# Altium footprint library smd-ipc.PCBLIB: 363 footprints (part 5 of 27)
Each footprint in its own frame and in the unit in brackets; x right, y up, seen from the top. Pads: shape width x height; smd on the part's side, far side on the other; paste and mask are expansions set on the pad; w line width, h text height; cw(c..) or ccw(c..) is an arc to the next point about the centre after c.
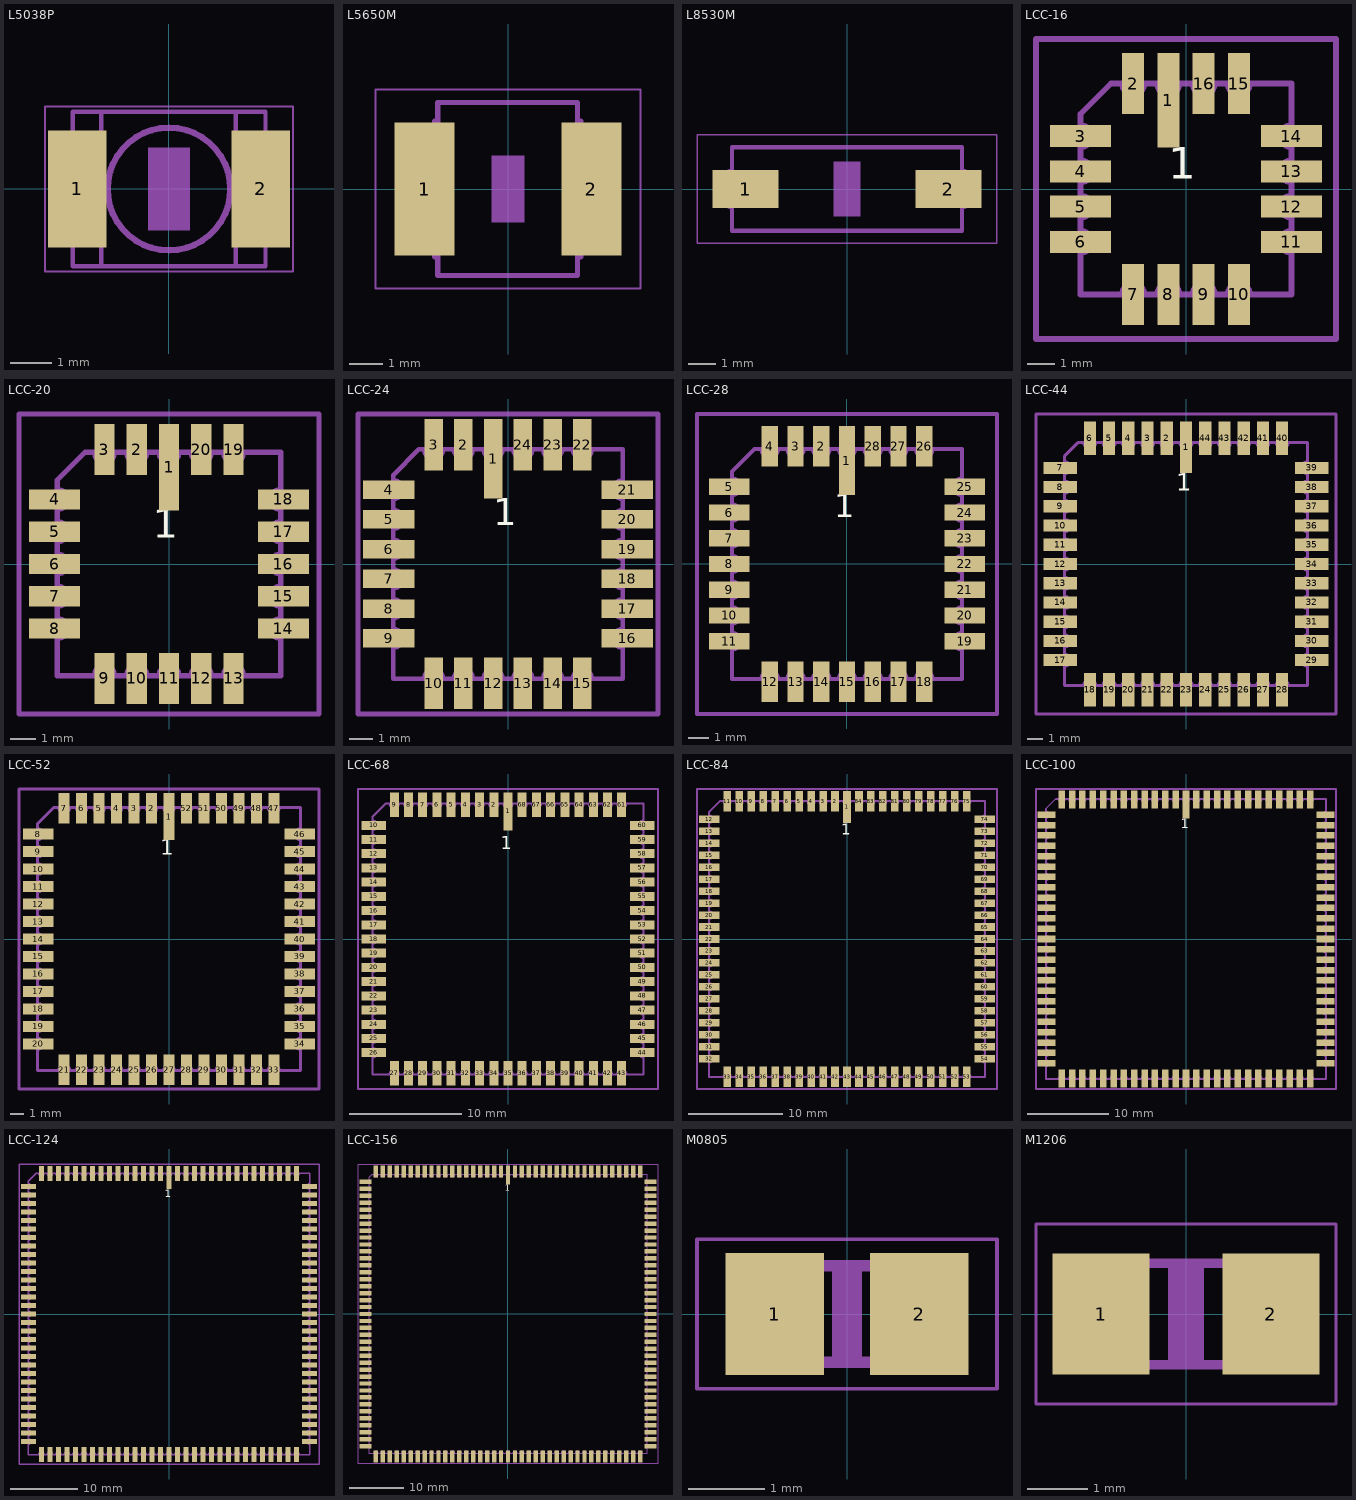
[diagram p4: the footprints below, top view; thin cyan lines are the x and y axes]

## L5038P [mm]
pads (2):
  rect 1.4x2.8 smd: 1(-2.2,0) 2(2.2,0)
Mechanical 6:
  rectangle: -0.5,-1 0.5,1
Mechanical 16:
  circle w0.152: c0,0 r1.473
  lines w0.102: -2.386,-1.27 -2.386,1.27 ; -2.31,-1.854 -2.31,1.854 ; -2.286,-1.856 2.311,-1.856 ; -2.286,1.853 2.311,1.853 ; -1.624,-1.854 -1.624,1.854 ; 1.602,-1.854 1.602,1.854 ; 2.313,-1.854 2.313,1.854 ; 2.389,-1.27 2.389,1.27
Mechanical 27:
  lines w0.051: -2.973,-1.983 2.973,-1.983 2.973,1.983 -2.973,1.983 -2.973,-1.983

## L5650M [mm]
pads (2):
  rect 1.8x4 smd: 1(-2.5,0) 2(2.5,0)
Mechanical 6:
  rectangle: -0.5,-1 0.5,1
Mechanical 16:
  lines w0.152: -2.21,-2.032 -2.21,2.032 ; 2.184,-2.032 2.184,2.032 ; -2.108,-2.591 2.083,-2.591 2.083,2.591 -2.108,2.591 -2.108,-2.591
Mechanical 27:
  lines w0.051: -3.973,-2.983 3.973,-2.983 3.973,2.983 -3.973,2.983 -3.973,-2.983

## L8530M [mm]
pads (2):
  rect 2.4x1.4 smd: 1(-3.7,0) 2(3.7,0)
Mechanical 6:
  rectangle: -0.5,-1 0.5,1
Mechanical 16:
  lines w0.152: -4.293,-0.66 -4.293,0.66 ; 4.293,-0.66 4.293,0.66 ; -4.191,-1.524 -4.191,1.524 4.191,1.524 4.191,-1.524 -4.191,-1.524
Mechanical 27:
  lines w0.051: -5.473,-1.983 5.473,-1.983 5.473,1.983 -5.473,1.983 -5.473,-1.983

## LCC-16 [mil]
pads (16):
  rect 31.5x133.86 smd: 1(-25,125.98)
  rect 31.5x86.61 smd: 2(-75,149.61) 7(-75,-149.61) 8(-25,-149.61) 9(25,-149.61) 10(75,-149.61) 15(75,149.61) 16(25,149.61)
  rect 86.61x31.5 smd: 3(-149.61,75) 4(-149.61,25) 5(-149.61,-25) 6(-149.61,-75) 11(149.61,-75) 12(149.61,-25) 13(149.61,25) 14(149.61,75)
Top Overlay:
  text "1" at -25,0 h77.5
Mechanical 16:
  lines w8: -149.61,-150 -149.61,-149.61 ; -149.61,-90.75 -149.61,-149.61 ; -149.61,-59.25 -149.61,-40.75 ; -149.61,-9.25 -149.61,9.25 ; -149.61,40.75 -149.61,59.25 ; -149.61,90.75 -149.61,106.3 -106.3,149.61 -90.75,149.61 ; -149.54,-90.75 ccw(c-149.54,-75) -149.54,-59.25 ; -149.54,-40.75 ccw(c-149.54,-25) -149.54,-9.25 ; -149.54,9.25 ccw(c-149.54,25) -149.54,40.75 ; -149.54,59.25 ccw(c-149.54,75) -149.54,90.75 ; -90.75,-149.61 -149.61,-149.61 ; -90.75,-149.54 cw(c-75,-149.54) -59.25,-149.54 ; -90.75,149.54 ccw(c-75,149.54) -59.25,149.54 ; -59.25,-149.61 -40.75,-149.61 ; -59.25,149.61 -40.75,149.61 ; -40.75,-149.54 cw(c-25,-149.54) -9.25,-149.54 ; -40.75,149.54 ccw(c-25,149.54) -9.25,149.54 ; -9.25,-149.61 9.25,-149.61 ; -9.25,149.61 9.25,149.61 ; 9.25,-149.54 cw(c25,-149.54) 40.75,-149.54 ; 9.25,149.54 ccw(c25,149.54) 40.75,149.54 ; 40.75,-149.61 59.25,-149.61 ; 40.75,149.61 59.25,149.61 ; 59.25,-149.54 cw(c75,-149.54) 90.75,-149.54 ; 59.25,149.54 ccw(c75,149.54) 90.75,149.54 ; 90.75,-149.61 149.61,-149.61 149.61,-90.75 ; 90.75,149.61 149.61,149.61 149.61,90.75 ; 149.54,-90.75 cw(c149.54,-75) 149.54,-59.25 ; 149.54,-40.75 cw(c149.54,-25) 149.54,-9.25 ; 149.54,9.25 cw(c149.54,25) 149.54,40.75 ; 149.54,59.25 cw(c149.54,75) 149.54,90.75 ; 149.61,-59.25 149.61,-40.75 ; 149.61,-9.25 149.61,9.25 ; 149.61,40.75 149.61,59.25
Mechanical 27:
  lines w7.87: -212.72,-212.72 212.72,-212.72 212.72,212.72 -212.72,212.72 -212.72,-212.72

## LCC-20 [mil]
pads (20):
  rect 31.5x133.86 smd: 1(0,149.61)
  rect 31.5x78.74 smd: 2(-50,177.17) 3(-100,177.17) 9(-100,-177.17) 10(-50,-177.17) 11(0,-177.17) 12(50,-177.17) 13(100,-177.17) 19(100,177.17) 20(50,177.17)
  rect 78.74x31.5 smd: 4(-177.17,100) 5(-177.17,50) 6(-177.17,0) 7(-177.17,-50) 8(-177.17,-100) 14(177.17,-100) 15(177.17,-50) 16(177.17,0) 17(177.17,50) 18(177.17,100)
Top Overlay:
  text "1" at -25,25 h77.5
Mechanical 16:
  lines w8: -173.23,-173.62 -173.23,-173.23 ; -173.23,-115.75 -173.23,-173.23 ; -173.23,-84.25 -173.23,-65.75 ; -173.23,-34.25 -173.23,-15.75 ; -173.23,15.75 -173.23,34.25 ; -173.23,65.75 -173.23,84.25 ; -173.23,115.75 -173.23,129.92 -129.92,173.23 -115.75,173.23 ; -173.17,-115.75 ccw(c-173.17,-100) -173.17,-84.25 ; -173.17,-65.75 ccw(c-173.17,-50) -173.17,-34.25 ; -173.17,-15.75 ccw(c-173.17,0) -173.17,15.75 ; -173.17,34.25 ccw(c-173.17,50) -173.17,65.75 ; -173.17,84.25 ccw(c-173.17,100) -173.17,115.75 ; -115.75,-173.23 -173.23,-173.23 ; -115.75,-173.17 cw(c-100,-173.17) -84.25,-173.17 ; -115.75,173.17 ccw(c-100,173.17) -84.25,173.17 ; -84.25,-173.23 -65.75,-173.23 ; -84.25,173.23 -65.75,173.23 ; -65.75,-173.17 cw(c-50,-173.17) -34.25,-173.17 ; -65.75,173.17 ccw(c-50,173.17) -34.25,173.17 ; -34.25,-173.23 -15.75,-173.23 ; -34.25,173.23 -15.75,173.23 ; -15.75,-173.17 cw(c0,-173.17) 15.75,-173.17 ; -15.75,173.17 ccw(c0,173.17) 15.75,173.17 ; 15.75,-173.23 34.25,-173.23 ; 15.75,173.23 34.25,173.23 ; 34.25,-173.17 cw(c50,-173.17) 65.75,-173.17 ; 34.25,173.17 ccw(c50,173.17) 65.75,173.17 ; 65.75,-173.23 84.25,-173.23 ; 65.75,173.23 84.25,173.23 ; 84.25,-173.17 cw(c100,-173.17) 115.75,-173.17 ; 84.25,173.17 ccw(c100,173.17) 115.75,173.17 ; 115.75,-173.23 173.23,-173.23 173.23,-115.75 ; 115.75,173.23 173.23,173.23 173.23,115.75 ; 173.17,-115.75 cw(c173.17,-100) 173.17,-84.25 ; 173.17,-65.75 cw(c173.17,-50) 173.17,-34.25 ; 173.17,-15.75 cw(c173.17,0) 173.17,15.75 ; 173.17,34.25 cw(c173.17,50) 173.17,65.75 ; 173.17,84.25 cw(c173.17,100) 173.17,115.75 ; 173.23,-84.25 173.23,-65.75 ; 173.23,-34.25 173.23,-15.75 ; 173.23,15.75 173.23,34.25 ; 173.23,65.75 173.23,84.25
Mechanical 27:
  lines w7.87: -232.4,-232.4 232.4,-232.4 232.4,232.4 -232.4,232.4 -232.4,-232.4

## LCC-24 [mil]
pads (24):
  rect 31.5x133.86 smd: 1(-25,177.17)
  rect 31.5x86.61 smd: 2(-75,200.79) 3(-125,200.79) 10(-125,-200.79) 11(-75,-200.79) 12(-25,-200.79) 13(25,-200.79) 14(75,-200.79) 15(125,-200.79) 22(125,200.79) 23(75,200.79) 24(25,200.79)
  rect 86.61x31.5 smd: 4(-200.79,125) 5(-200.79,75) 6(-200.79,25) 7(-200.79,-25) 8(-200.79,-75) 9(-200.79,-125) 16(200.79,-125) 17(200.79,-75) 18(200.79,-25) 19(200.79,25) 20(200.79,75) 21(200.79,125)
Top Overlay:
  text "1" at -25,50 h77.5
Mechanical 16:
  lines w8: -192.91,-140.75 -192.91,-192.91 -140.75,-192.91 ; -192.91,-109.25 -192.91,-90.75 ; -192.91,-59.25 -192.91,-40.75 ; -192.91,-9.25 -192.91,9.25 ; -192.91,40.75 -192.91,59.25 ; -192.91,90.75 -192.91,109.25 ; -192.91,140.75 -192.91,149.41 -149.61,192.72 -140.75,192.72 ; -192.85,-140.75 ccw(c-192.85,-125) -192.85,-109.25 ; -192.85,-90.75 ccw(c-192.85,-75) -192.85,-59.25 ; -192.85,-40.75 ccw(c-192.85,-25) -192.85,-9.25 ; -192.85,9.25 ccw(c-192.85,25) -192.85,40.75 ; -192.85,59.25 ccw(c-192.85,75) -192.85,90.75 ; -192.85,109.25 ccw(c-192.85,125) -192.85,140.75 ; -140.75,-192.85 cw(c-125,-192.85) -109.25,-192.85 ; -140.75,192.65 ccw(c-125,192.65) -109.25,192.65 ; -109.25,-192.91 -90.75,-192.91 ; -109.25,192.72 -90.75,192.72 ; -90.75,-192.85 cw(c-75,-192.85) -59.25,-192.85 ; -90.75,192.65 ccw(c-75,192.65) -59.25,192.65 ; -59.25,-192.91 -40.75,-192.91 ; -59.25,192.72 -40.75,192.72 ; -40.75,-192.85 cw(c-25,-192.85) -9.25,-192.85 ; -40.75,192.65 ccw(c-25,192.65) -9.25,192.65 ; -9.25,-192.91 9.25,-192.91 ; -9.25,192.72 9.25,192.72 ; 9.25,-192.85 cw(c25,-192.85) 40.75,-192.85 ; 9.25,192.65 ccw(c25,192.65) 40.75,192.65 ; 40.75,-192.91 59.25,-192.91 ; 40.75,192.72 59.25,192.72 ; 59.25,-192.85 cw(c75,-192.85) 90.75,-192.85 ; 59.25,192.65 ccw(c75,192.65) 90.75,192.65 ; 90.75,-192.91 109.25,-192.91 ; 90.75,192.72 109.25,192.72 ; 109.25,-192.85 cw(c125,-192.85) 140.75,-192.85 ; 109.25,192.65 ccw(c125,192.65) 140.75,192.65 ; 140.75,-192.91 192.91,-192.91 192.91,-140.75 ; 140.75,192.72 192.91,192.72 192.91,140.75 ; 192.85,-140.75 cw(c192.85,-125) 192.85,-109.25 ; 192.85,-90.75 cw(c192.85,-75) 192.85,-59.25 ; 192.85,-40.75 cw(c192.85,-25) 192.85,-9.25 ; 192.85,9.25 cw(c192.85,25) 192.85,40.75 ; 192.85,59.25 cw(c192.85,75) 192.85,90.75 ; 192.85,109.25 cw(c192.85,125) 192.85,140.75 ; 192.91,-109.25 192.91,-90.75 ; 192.91,-59.25 192.91,-40.75 ; 192.91,-9.25 192.91,9.25 ; 192.91,40.75 192.91,59.25 ; 192.91,90.75 192.91,109.25
Mechanical 27:
  lines w7.87: -252.09,-252.09 252.09,-252.09 252.09,252.09 -252.09,252.09 -252.09,-252.09

## LCC-28 [mil]
pads (28):
  rect 31.5x133.86 smd: 1(0,200.79)
  rect 31.5x78.74 smd: 2(-50,228.35) 3(-100,228.35) 4(-150,228.35) 12(-150,-228.35) 13(-100,-228.35) 14(-50,-228.35) 15(0,-228.35) 16(50,-228.35) 17(100,-228.35) 18(150,-228.35) 26(150,228.35) 27(100,228.35) 28(50,228.35)
  rect 78.74x31.5 smd: 5(-228.35,150) 6(-228.35,100) 7(-228.35,50) 8(-228.35,0) 9(-228.35,-50) 10(-228.35,-100) 11(-228.35,-150) 19(228.35,-150) 20(228.35,-100) 21(228.35,-50) 22(228.35,0) 23(228.35,50) 24(228.35,100) 25(228.35,150)
Top Overlay:
  text "1" at -25,75 h77.5
Mechanical 16:
  lines w8: -223.23,-165.75 -223.23,-223.23 ; -223.23,-134.25 -223.23,-115.75 ; -223.23,-84.25 -223.23,-65.75 ; -223.23,-34.25 -223.23,-15.75 ; -223.23,15.75 -223.23,34.25 ; -223.23,65.75 -223.23,84.25 ; -223.23,115.75 -223.23,134.25 ; -223.23,165.75 -223.23,179.92 -179.92,223.23 -165.75,223.23 ; -223.17,-165.75 ccw(c-223.17,-150) -223.17,-134.25 ; -223.17,-115.75 ccw(c-223.17,-100) -223.17,-84.25 ; -223.17,-65.75 ccw(c-223.17,-50) -223.17,-34.25 ; -223.17,-15.75 ccw(c-223.17,0) -223.17,15.75 ; -223.17,34.25 ccw(c-223.17,50) -223.17,65.75 ; -223.17,84.25 ccw(c-223.17,100) -223.17,115.75 ; -223.17,134.25 ccw(c-223.17,150) -223.17,165.75 ; -165.75,-223.23 -223.23,-223.23 ; -165.75,-223.17 cw(c-150,-223.17) -134.25,-223.17 ; -165.75,223.17 ccw(c-150,223.17) -134.25,223.17 ; -134.25,-223.23 -115.75,-223.23 ; -134.25,223.23 -115.75,223.23 ; -123.23,-223.62 -223.23,-223.23 ; -115.75,-223.17 cw(c-100,-223.17) -84.25,-223.17 ; -115.75,223.17 ccw(c-100,223.17) -84.25,223.17 ; -84.25,-223.23 -65.75,-223.23 ; -84.25,223.23 -65.75,223.23 ; -65.75,-223.17 cw(c-50,-223.17) -34.25,-223.17 ; -65.75,223.17 ccw(c-50,223.17) -34.25,223.17 ; -34.25,-223.23 -15.75,-223.23 ; -34.25,223.23 -15.75,223.23 ; -15.75,-223.17 cw(c0,-223.17) 15.75,-223.17 ; -15.75,223.17 ccw(c0,223.17) 15.75,223.17 ; 15.75,-223.23 34.25,-223.23 ; 15.75,223.23 34.25,223.23 ; 34.25,-223.17 cw(c50,-223.17) 65.75,-223.17 ; 34.25,223.17 ccw(c50,223.17) 65.75,223.17 ; 65.75,-223.23 84.25,-223.23 ; 65.75,223.23 84.25,223.23 ; 84.25,-223.17 cw(c100,-223.17) 115.75,-223.17 ; 84.25,223.17 ccw(c100,223.17) 115.75,223.17 ; 115.75,-223.23 134.25,-223.23 ; 115.75,223.23 134.25,223.23 ; 134.25,-223.17 cw(c150,-223.17) 165.75,-223.17 ; 134.25,223.17 ccw(c150,223.17) 165.75,223.17 ; 165.75,-223.23 223.23,-223.23 223.23,-165.75 ; 165.75,223.23 223.23,223.23 223.23,165.75 ; 223.17,-165.75 cw(c223.17,-150) 223.17,-134.25 ; 223.17,-115.75 cw(c223.17,-100) 223.17,-84.25 ; 223.17,-65.75 cw(c223.17,-50) 223.17,-34.25 ; 223.17,-15.75 cw(c223.17,0) 223.17,15.75 ; 223.17,34.25 cw(c223.17,50) 223.17,65.75 ; 223.17,84.25 cw(c223.17,100) 223.17,115.75 ; 223.17,134.25 cw(c223.17,150) 223.17,165.75 ; 223.23,-134.25 223.23,-115.75 ; 223.23,-84.25 223.23,-65.75 ; 223.23,-34.25 223.23,-15.75 ; 223.23,15.75 223.23,34.25 ; 223.23,65.75 223.23,84.25 ; 223.23,115.75 223.23,134.25
Mechanical 27:
  lines w7.87: -291.46,-291.46 291.46,-291.46 291.46,291.46 -291.46,291.46 -291.46,-291.46

## LCC-44 [mil]
pads (44):
  rect 31.5x133.86 smd: 1(0,303.15)
  rect 31.5x86.61 smd: 2(-50,326.77) 3(-100,326.77) 4(-150,326.77) 5(-200,326.77) 6(-250,326.77) 18(-250,-326.77) 19(-200,-326.77) 20(-150,-326.77) 21(-100,-326.77) 22(-50,-326.77) 23(0,-326.77) 24(50,-326.77) 25(100,-326.77) 26(150,-326.77) 27(200,-326.77) 28(250,-326.77) 40(250,326.77) 41(200,326.77) 42(150,326.77) 43(100,326.77) 44(50,326.77)
  rect 86.61x31.5 smd: 7(-326.77,250) 8(-326.77,200) 9(-326.77,150) 10(-326.77,100) 11(-326.77,50) 12(-326.77,0) 13(-326.77,-50) 14(-326.77,-100) 15(-326.77,-150) 16(-326.77,-200) 17(-326.77,-250) 29(326.77,-250) 30(326.77,-200) 31(326.77,-150) 32(326.77,-100) 33(326.77,-50) 34(326.77,0) 35(326.77,50) 36(326.77,100) 37(326.77,150) 38(326.77,200) 39(326.77,250)
Top Overlay:
  text "1" at -25,175 h77.5
Mechanical 16:
  lines w8: -316.14,-265.75 -316.14,-316.14 -265.75,-316.14 ; -316.14,-234.25 -316.14,-215.75 ; -316.14,-184.25 -316.14,-165.75 ; -316.14,-134.25 -316.14,-115.75 ; -316.14,-84.25 -316.14,-65.75 ; -316.14,-34.25 -316.14,-15.75 ; -316.14,15.75 -316.14,34.25 ; -316.14,65.75 -316.14,84.25 ; -316.14,115.75 -316.14,134.25 ; -316.14,165.75 -316.14,184.25 ; -316.14,215.75 -316.14,234.25 ; -316.14,265.75 -316.14,279.92 -279.92,316.14 -265.75,316.14 ; -316.08,-265.75 ccw(c-316.08,-250) -316.08,-234.25 ; -316.08,-215.75 ccw(c-316.08,-200) -316.08,-184.25 ; -316.08,-165.75 ccw(c-316.08,-150) -316.08,-134.25 ; -316.08,-115.75 ccw(c-316.08,-100) -316.08,-84.25 ; -316.08,-65.75 ccw(c-316.08,-50) -316.08,-34.25 ; -316.08,-15.75 ccw(c-316.08,0) -316.08,15.75 ; -316.08,34.25 ccw(c-316.08,50) -316.08,65.75 ; -316.08,84.25 ccw(c-316.08,100) -316.08,115.75 ; -316.08,134.25 ccw(c-316.08,150) -316.08,165.75 ; -316.08,184.25 ccw(c-316.08,200) -316.08,215.75 ; -316.08,234.25 ccw(c-316.08,250) -316.08,265.75 ; -265.75,-316.08 cw(c-250,-316.08) -234.25,-316.08 ; -265.75,316.08 ccw(c-250,316.08) -234.25,316.08 ; -234.25,-316.14 -215.75,-316.14 ; -234.25,316.14 -215.75,316.14 ; -215.75,-316.08 cw(c-200,-316.08) -184.25,-316.08 ; -215.75,316.08 ccw(c-200,316.08) -184.25,316.08 ; -184.25,-316.14 -165.75,-316.14 ; -184.25,316.14 -165.75,316.14 ; -165.75,-316.08 cw(c-150,-316.08) -134.25,-316.08 ; -165.75,316.08 ccw(c-150,316.08) -134.25,316.08 ; -134.25,-316.14 -115.75,-316.14 ; -134.25,316.14 -115.75,316.14 ; -115.75,-316.08 cw(c-100,-316.08) -84.25,-316.08 ; -115.75,316.08 ccw(c-100,316.08) -84.25,316.08 ; -84.25,-316.14 -65.75,-316.14 ; -84.25,316.14 -65.75,316.14 ; -65.75,-316.08 cw(c-50,-316.08) -34.25,-316.08 ; -65.75,316.08 ccw(c-50,316.08) -34.25,316.08 ; -34.25,-316.14 -15.75,-316.14 ; -34.25,316.14 -15.75,316.14 ; -15.75,-316.08 cw(c0,-316.08) 15.75,-316.08 ; -15.75,316.08 ccw(c0,316.08) 15.75,316.08 ; 15.75,-316.14 34.25,-316.14 ; 15.75,316.14 34.25,316.14 ; 34.25,-316.08 cw(c50,-316.08) 65.75,-316.08 ; 34.25,316.08 ccw(c50,316.08) 65.75,316.08 ; 65.75,-316.14 84.25,-316.14 ; 65.75,316.14 84.25,316.14 ; 84.25,-316.08 cw(c100,-316.08) 115.75,-316.08 ; 84.25,316.08 ccw(c100,316.08) 115.75,316.08 ; 115.75,-316.14 134.25,-316.14 ; 115.75,316.14 134.25,316.14 ; 134.25,-316.08 cw(c150,-316.08) 165.75,-316.08 ; 134.25,316.08 ccw(c150,316.08) 165.75,316.08 ; 165.75,-316.14 184.25,-316.14 ; 165.75,316.14 184.25,316.14 ; 184.25,-316.08 cw(c200,-316.08) 215.75,-316.08 ; 184.25,316.08 ccw(c200,316.08) 215.75,316.08 ; 215.75,-316.14 234.25,-316.14 ; 215.75,316.14 234.25,316.14 ; 234.25,-316.08 cw(c250,-316.08) 265.75,-316.08 ; 234.25,316.08 ccw(c250,316.08) 265.75,316.08 ; 265.75,-316.14 316.14,-316.14 316.14,-265.75 ; 265.75,316.14 316.14,316.14 316.14,265.75 ; 316.08,-265.75 cw(c316.08,-250) 316.08,-234.25 ; 316.08,-215.75 cw(c316.08,-200) 316.08,-184.25 ; 316.08,-165.75 cw(c316.08,-150) 316.08,-134.25 ; 316.08,-115.75 cw(c316.08,-100) 316.08,-84.25 ; 316.08,-65.75 cw(c316.08,-50) 316.08,-34.25 ; 316.08,-15.75 cw(c316.08,0) 316.08,15.75 ; 316.08,34.25 cw(c316.08,50) 316.08,65.75 ; 316.08,84.25 cw(c316.08,100) 316.08,115.75 ; 316.08,134.25 cw(c316.08,150) 316.08,165.75 ; 316.08,184.25 cw(c316.08,200) 316.08,215.75 ; 316.08,234.25 cw(c316.08,250) 316.08,265.75 ; 316.14,-234.25 316.14,-215.75 ; 316.14,-184.25 316.14,-165.75 ; 316.14,-134.25 316.14,-115.75 ; 316.14,-84.25 316.14,-65.75 ; 316.14,-34.25 316.14,-15.75 ; 316.14,15.75 316.14,34.25 ; 316.14,65.75 316.14,84.25 ; 316.14,115.75 316.14,134.25 ; 316.14,165.75 316.14,184.25 ; 316.14,215.75 316.14,234.25
Mechanical 27:
  lines w7.87: -389.88,-389.88 389.88,-389.88 389.88,389.88 -389.88,389.88 -389.88,-389.88

## LCC-52 [mil]
pads (52):
  rect 31.5x133.86 smd: 1(0,350.39)
  rect 31.5x86.61 smd: 2(-50,374.02) 3(-100,374.02) 4(-150,374.02) 5(-200,374.02) 6(-250,374.02) 7(-300,374.02) 21(-300,-374.02) 22(-250,-374.02) 23(-200,-374.02) 24(-150,-374.02) 25(-100,-374.02) 26(-50,-374.02) 27(0,-374.02) 28(50,-374.02) 29(100,-374.02) 30(150,-374.02) 31(200,-374.02) 32(250,-374.02) 33(300,-374.02) 47(300,374.02) 48(250,374.02) 49(200,374.02) 50(150,374.02) 51(100,374.02) 52(50,374.02)
  rect 86.61x31.5 smd: 8(-374.02,300) 9(-374.02,250) 10(-374.02,200) 11(-374.02,150) 12(-374.02,100) 13(-374.02,50) 14(-374.02,0) 15(-374.02,-50) 16(-374.02,-100) 17(-374.02,-150) 18(-374.02,-200) 19(-374.02,-250) 20(-374.02,-300) 34(374.02,-300) 35(374.02,-250) 36(374.02,-200) 37(374.02,-150) 38(374.02,-100) 39(374.02,-50) 40(374.02,0) 41(374.02,50) 42(374.02,100) 43(374.02,150) 44(374.02,200) 45(374.02,250) 46(374.02,300)
Top Overlay:
  text "1" at -25,225 h77.5
Mechanical 16:
  lines w8: -376.38,-315.75 -376.38,-376.38 -315.75,-376.38 ; -376.38,-284.25 -376.38,-265.75 ; -376.38,-234.25 -376.38,-215.75 ; -376.38,-184.25 -376.38,-165.75 ; -376.38,-134.25 -376.38,-115.75 ; -376.38,-84.25 -376.38,-65.75 ; -376.38,-34.25 -376.38,-15.75 ; -376.38,15.75 -376.38,34.25 ; -376.38,65.75 -376.38,84.25 ; -376.38,115.75 -376.38,134.25 ; -376.38,165.75 -376.38,184.25 ; -376.38,215.75 -376.38,234.25 ; -376.38,265.75 -376.38,284.25 ; -376.38,315.75 -376.38,329.92 -329.92,376.38 -315.75,376.38 ; -376.31,-315.75 ccw(c-376.31,-300) -376.31,-284.25 ; -376.31,-265.75 ccw(c-376.31,-250) -376.31,-234.25 ; -376.31,-215.75 ccw(c-376.31,-200) -376.31,-184.25 ; -376.31,-165.75 ccw(c-376.31,-150) -376.31,-134.25 ; -376.31,-115.75 ccw(c-376.31,-100) -376.31,-84.25 ; -376.31,-65.75 ccw(c-376.31,-50) -376.31,-34.25 ; -376.31,-15.75 ccw(c-376.31,0) -376.31,15.75 ; -376.31,34.25 ccw(c-376.31,50) -376.31,65.75 ; -376.31,84.25 ccw(c-376.31,100) -376.31,115.75 ; -376.31,134.25 ccw(c-376.31,150) -376.31,165.75 ; -376.31,184.25 ccw(c-376.31,200) -376.31,215.75 ; -376.31,234.25 ccw(c-376.31,250) -376.31,265.75 ; -376.31,284.25 ccw(c-376.31,300) -376.31,315.75 ; -315.75,-376.31 cw(c-300,-376.31) -284.25,-376.31 ; -315.75,376.31 ccw(c-300,376.31) -284.25,376.31 ; -284.25,-376.38 -265.75,-376.38 ; -284.25,376.38 -265.75,376.38 ; -265.75,-376.31 cw(c-250,-376.31) -234.25,-376.31 ; -265.75,376.31 ccw(c-250,376.31) -234.25,376.31 ; -234.25,-376.38 -215.75,-376.38 ; -234.25,376.38 -215.75,376.38 ; -215.75,-376.31 cw(c-200,-376.31) -184.25,-376.31 ; -215.75,376.31 ccw(c-200,376.31) -184.25,376.31 ; -184.25,-376.38 -165.75,-376.38 ; -184.25,376.38 -165.75,376.38 ; -165.75,-376.31 cw(c-150,-376.31) -134.25,-376.31 ; -165.75,376.31 ccw(c-150,376.31) -134.25,376.31 ; -134.25,-376.38 -115.75,-376.38 ; -134.25,376.38 -115.75,376.38 ; -115.75,-376.31 cw(c-100,-376.31) -84.25,-376.31 ; -115.75,376.31 ccw(c-100,376.31) -84.25,376.31 ; -84.25,-376.38 -65.75,-376.38 ; -84.25,376.38 -65.75,376.38 ; -65.75,-376.31 cw(c-50,-376.31) -34.25,-376.31 ; -65.75,376.31 ccw(c-50,376.31) -34.25,376.31 ; -34.25,-376.38 -15.75,-376.38 ; -34.25,376.38 -15.75,376.38 ; -15.75,-376.31 cw(c0,-376.31) 15.75,-376.31 ; -15.75,376.31 ccw(c0,376.31) 15.75,376.31 ; 15.75,-376.38 34.25,-376.38 ; 15.75,376.38 34.25,376.38 ; 34.25,-376.31 cw(c50,-376.31) 65.75,-376.31 ; 34.25,376.31 ccw(c50,376.31) 65.75,376.31 ; 65.75,-376.38 84.25,-376.38 ; 65.75,376.38 84.25,376.38 ; 84.25,-376.31 cw(c100,-376.31) 115.75,-376.31 ; 84.25,376.31 ccw(c100,376.31) 115.75,376.31 ; 115.75,-376.38 134.25,-376.38 ; 115.75,376.38 134.25,376.38 ; 134.25,-376.31 cw(c150,-376.31) 165.75,-376.31 ; 134.25,376.31 ccw(c150,376.31) 165.75,376.31 ; 165.75,-376.38 184.25,-376.38 ; 165.75,376.38 184.25,376.38 ; 184.25,-376.31 cw(c200,-376.31) 215.75,-376.31 ; 184.25,376.31 ccw(c200,376.31) 215.75,376.31 ; 215.75,-376.38 234.25,-376.38 ; 215.75,376.38 234.25,376.38 ; 234.25,-376.31 cw(c250,-376.31) 265.75,-376.31 ; 234.25,376.31 ccw(c250,376.31) 265.75,376.31 ; 265.75,-376.38 284.25,-376.38 ; 265.75,376.38 284.25,376.38 ; 284.25,-376.31 cw(c300,-376.31) 315.75,-376.31 ; 284.25,376.31 ccw(c300,376.31) 315.75,376.31 ; 315.75,-376.38 376.38,-376.38 376.38,-315.75 ; 315.75,376.38 376.38,376.38 376.38,315.75 ; 376.31,-315.75 cw(c376.31,-300) 376.31,-284.25 ; 376.31,-265.75 cw(c376.31,-250) 376.31,-234.25 ; 376.31,-215.75 cw(c376.31,-200) 376.31,-184.25 ; 376.31,-165.75 cw(c376.31,-150) 376.31,-134.25 ; 376.31,-115.75 cw(c376.31,-100) 376.31,-84.25 ; 376.31,-65.75 cw(c376.31,-50) 376.31,-34.25 ; 376.31,-15.75 cw(c376.31,0) 376.31,15.75 ; 376.31,34.25 cw(c376.31,50) 376.31,65.75 ; 376.31,84.25 cw(c376.31,100) 376.31,115.75 ; 376.31,134.25 cw(c376.31,150) 376.31,165.75 ; 376.31,184.25 cw(c376.31,200) 376.31,215.75 ; 376.31,234.25 cw(c376.31,250) 376.31,265.75 ; 376.31,284.25 cw(c376.31,300) 376.31,315.75 ; 376.38,-284.25 376.38,-265.75 ; 376.38,-234.25 376.38,-215.75 ; 376.38,-184.25 376.38,-165.75 ; 376.38,-134.25 376.38,-115.75 ; 376.38,-84.25 376.38,-65.75 ; 376.38,-34.25 376.38,-15.75 ; 376.38,15.75 376.38,34.25 ; 376.38,65.75 376.38,84.25 ; 376.38,115.75 376.38,134.25 ; 376.38,165.75 376.38,184.25 ; 376.38,215.75 376.38,234.25 ; 376.38,265.75 376.38,284.25
Mechanical 27:
  lines w7.87: -429.25,-429.25 429.25,-429.25 429.25,429.25 -429.25,429.25 -429.25,-429.25

## LCC-68 [mil]
pads (68):
  rect 31.5x133.86 smd: 1(0,448.82)
  rect 31.5x86.61 smd: 2(-50,472.44) 3(-100,472.44) 4(-150,472.44) 5(-200,472.44) 6(-250,472.44) 7(-300,472.44) 8(-350,472.44) 9(-400,472.44) 27(-400,-472.44) 28(-350,-472.44) 29(-300,-472.44) 30(-250,-472.44) 31(-200,-472.44) 32(-150,-472.44) 33(-100,-472.44) 34(-50,-472.44) 35(0,-472.44) 36(50,-472.44) 37(100,-472.44) 38(150,-472.44) 39(200,-472.44) 40(250,-472.44) 41(300,-472.44) 42(350,-472.44) 43(400,-472.44) 61(400,472.44) 62(350,472.44) 63(300,472.44) 64(250,472.44) 65(200,472.44) 66(150,472.44) 67(100,472.44) 68(50,472.44)
  rect 86.61x31.5 smd: 10(-472.44,400) 11(-472.44,350) 12(-472.44,300) 13(-472.44,250) 14(-472.44,200) 15(-472.44,150) 16(-472.44,100) 17(-472.44,50) 18(-472.44,0) 19(-472.44,-50) 20(-472.44,-100) 21(-472.44,-150) 22(-472.44,-200) 23(-472.44,-250) 24(-472.44,-300) 25(-472.44,-350) 26(-472.44,-400) 44(472.44,-400) 45(472.44,-350) 46(472.44,-300) 47(472.44,-250) 48(472.44,-200) 49(472.44,-150) 50(472.44,-100) 51(472.44,-50) 52(472.44,0) 53(472.44,50) 54(472.44,100) 55(472.44,150) 56(472.44,200) 57(472.44,250) 58(472.44,300) 59(472.44,350) 60(472.44,400)
Top Overlay:
  text "1" at -25,300 h77.5
Mechanical 16:
  lines w8: -476.38,-415.75 -476.38,-476.38 -415.75,-476.38 ; -476.38,-384.25 -476.38,-365.75 ; -476.38,-334.25 -476.38,-315.75 ; -476.38,-284.25 -476.38,-265.75 ; -476.38,-234.25 -476.38,-215.75 ; -476.38,-184.25 -476.38,-165.75 ; -476.38,-134.25 -476.38,-115.75 ; -476.38,-84.25 -476.38,-65.75 ; -476.38,-34.25 -476.38,-15.75 ; -476.38,15.75 -476.38,34.25 ; -476.38,65.75 -476.38,84.25 ; -476.38,115.75 -476.38,134.25 ; -476.38,165.75 -476.38,184.25 ; -476.38,215.75 -476.38,234.25 ; -476.38,265.75 -476.38,284.25 ; -476.38,315.75 -476.38,334.25 ; -476.38,365.75 -476.38,384.25 ; -476.38,415.75 -476.38,429.92 -429.92,476.38 -415.75,476.38 ; -476.31,-415.75 ccw(c-476.31,-400) -476.31,-384.25 ; -476.31,-365.75 ccw(c-476.31,-350) -476.31,-334.25 ; -476.31,-315.75 ccw(c-476.31,-300) -476.31,-284.25 ; -476.31,-265.75 ccw(c-476.31,-250) -476.31,-234.25 ; -476.31,-215.75 ccw(c-476.31,-200) -476.31,-184.25 ; -476.31,-165.75 ccw(c-476.31,-150) -476.31,-134.25 ; -476.31,-115.75 ccw(c-476.31,-100) -476.31,-84.25 ; -476.31,-65.75 ccw(c-476.31,-50) -476.31,-34.25 ; -476.31,-15.75 ccw(c-476.31,0) -476.31,15.75 ; -476.31,34.25 ccw(c-476.31,50) -476.31,65.75 ; -476.31,84.25 ccw(c-476.31,100) -476.31,115.75 ; -476.31,134.25 ccw(c-476.31,150) -476.31,165.75 ; -476.31,184.25 ccw(c-476.31,200) -476.31,215.75 ; -476.31,234.25 ccw(c-476.31,250) -476.31,265.75 ; -476.31,284.25 ccw(c-476.31,300) -476.31,315.75 ; -476.31,334.25 ccw(c-476.31,350) -476.31,365.75 ; -476.31,384.25 ccw(c-476.31,400) -476.31,415.75 ; -415.75,-476.31 cw(c-400,-476.31) -384.25,-476.31 ; -415.75,476.31 ccw(c-400,476.31) -384.25,476.31 ; -384.25,-476.38 -365.75,-476.38 ; -384.25,476.38 -365.75,476.38 ; -365.75,-476.31 cw(c-350,-476.31) -334.25,-476.31 ; -365.75,476.31 ccw(c-350,476.31) -334.25,476.31 ; -334.25,-476.38 -315.75,-476.38 ; -334.25,476.38 -315.75,476.38 ; -315.75,-476.31 cw(c-300,-476.31) -284.25,-476.31 ; -315.75,476.31 ccw(c-300,476.31) -284.25,476.31 ; -284.25,-476.38 -265.75,-476.38 ; -284.25,476.38 -265.75,476.38 ; -265.75,-476.31 cw(c-250,-476.31) -234.25,-476.31 ; -265.75,476.31 ccw(c-250,476.31) -234.25,476.31 ; -234.25,-476.38 -215.75,-476.38 ; -234.25,476.38 -215.75,476.38 ; -215.75,-476.31 cw(c-200,-476.31) -184.25,-476.31 ; -215.75,476.31 ccw(c-200,476.31) -184.25,476.31 ; -184.25,-476.38 -165.75,-476.38 ; -184.25,476.38 -165.75,476.38 ; -165.75,-476.31 cw(c-150,-476.31) -134.25,-476.31 ; -165.75,476.31 ccw(c-150,476.31) -134.25,476.31 ; -134.25,-476.38 -115.75,-476.38 ; -134.25,476.38 -115.75,476.38 ; -115.75,-476.31 cw(c-100,-476.31) -84.25,-476.31 ; -115.75,476.31 ccw(c-100,476.31) -84.25,476.31 ; -84.25,-476.38 -65.75,-476.38 ; -84.25,476.38 -65.75,476.38 ; -65.75,-476.31 cw(c-50,-476.31) -34.25,-476.31 ; -65.75,476.31 ccw(c-50,476.31) -34.25,476.31 ; -34.25,-476.38 -15.75,-476.38 ; -34.25,476.38 -15.75,476.38 ; -15.75,-476.31 cw(c0,-476.31) 15.75,-476.31 ; -15.75,476.31 ccw(c0,476.31) 15.75,476.31 ; 15.75,-476.38 34.25,-476.38 ; 15.75,476.38 34.25,476.38 ; 34.25,-476.31 cw(c50,-476.31) 65.75,-476.31 ; 34.25,476.31 ccw(c50,476.31) 65.75,476.31 ; 65.75,-476.38 84.25,-476.38 ; 65.75,476.38 84.25,476.38 ; 84.25,-476.31 cw(c100,-476.31) 115.75,-476.31 ; 84.25,476.31 ccw(c100,476.31) 115.75,476.31 ; 115.75,-476.38 134.25,-476.38 ; 115.75,476.38 134.25,476.38 ; 134.25,-476.31 cw(c150,-476.31) 165.75,-476.31 ; 134.25,476.31 ccw(c150,476.31) 165.75,476.31 ; 165.75,-476.38 184.25,-476.38 ; 165.75,476.38 184.25,476.38 ; 184.25,-476.31 cw(c200,-476.31) 215.75,-476.31 ; 184.25,476.31 ccw(c200,476.31) 215.75,476.31 ; 215.75,-476.38 234.25,-476.38 ; 215.75,476.38 234.25,476.38 ; 234.25,-476.31 cw(c250,-476.31) 265.75,-476.31 ; 234.25,476.31 ccw(c250,476.31) 265.75,476.31 ; 265.75,-476.38 284.25,-476.38 ; 265.75,476.38 284.25,476.38 ; 284.25,-476.31 cw(c300,-476.31) 315.75,-476.31 ; 284.25,476.31 ccw(c300,476.31) 315.75,476.31 ; 315.75,-476.38 334.25,-476.38 ; 315.75,476.38 334.25,476.38 ; 334.25,-476.31 cw(c350,-476.31) 365.75,-476.31 ; 334.25,476.31 ccw(c350,476.31) 365.75,476.31 ; 365.75,-476.38 384.25,-476.38 ; 365.75,476.38 384.25,476.38 ; 384.25,-476.31 cw(c400,-476.31) 415.75,-476.31 ; 384.25,476.31 ccw(c400,476.31) 415.75,476.31 ; 415.75,-476.38 476.38,-476.38 476.38,-415.75 ; 415.75,476.38 476.38,476.38 476.38,415.75 ; 476.31,-415.75 cw(c476.31,-400) 476.31,-384.25 ; 476.31,-365.75 cw(c476.31,-350) 476.31,-334.25 ; 476.31,-315.75 cw(c476.31,-300) 476.31,-284.25 ; 476.31,-265.75 cw(c476.31,-250) 476.31,-234.25 ; 476.31,-215.75 cw(c476.31,-200) 476.31,-184.25 ; 476.31,-165.75 cw(c476.31,-150) 476.31,-134.25 ; 476.31,-115.75 cw(c476.31,-100) 476.31,-84.25 ; 476.31,-65.75 cw(c476.31,-50) 476.31,-34.25 ; 476.31,-15.75 cw(c476.31,0) 476.31,15.75 ; 476.31,34.25 cw(c476.31,50) 476.31,65.75 ; 476.31,84.25 cw(c476.31,100) 476.31,115.75 ; 476.31,134.25 cw(c476.31,150) 476.31,165.75 ; 476.31,184.25 cw(c476.31,200) 476.31,215.75 ; 476.31,234.25 cw(c476.31,250) 476.31,265.75 ; 476.31,284.25 cw(c476.31,300) 476.31,315.75 ; 476.31,334.25 cw(c476.31,350) 476.31,365.75 ; 476.31,384.25 cw(c476.31,400) 476.31,415.75 ; 476.38,-384.25 476.38,-365.75 ; 476.38,-334.25 476.38,-315.75 ; 476.38,-284.25 476.38,-265.75 ; 476.38,-234.25 476.38,-215.75 ; 476.38,-184.25 476.38,-165.75 ; 476.38,-134.25 476.38,-115.75 ; 476.38,-84.25 476.38,-65.75 ; 476.38,-34.25 476.38,-15.75 ; 476.38,15.75 476.38,34.25 ; 476.38,65.75 476.38,84.25 ; 476.38,115.75 476.38,134.25 ; 476.38,165.75 476.38,184.25 ; 476.38,215.75 476.38,234.25 ; 476.38,265.75 476.38,284.25 ; 476.38,315.75 476.38,334.25 ; 476.38,365.75 476.38,384.25
Mechanical 27:
  lines w7.87: -527.68,-527.68 527.68,-527.68 527.68,527.68 -527.68,527.68 -527.68,-527.68

## LCC-84 [mil]
pads (84):
  rect 31.5x133.86 smd: 1(0,551.18)
  rect 31.5x86.61 smd: 2(-50,574.8) 3(-100,574.8) 4(-150,574.8) 5(-200,574.8) 6(-250,574.8) 7(-300,574.8) 8(-350,574.8) 9(-400,574.8) 10(-450,574.8) 11(-500,574.8) 33(-500,-574.8) 34(-450,-574.8) 35(-400,-574.8) 36(-350,-574.8) 37(-300,-574.8) 38(-250,-574.8) 39(-200,-574.8) 40(-150,-574.8) 41(-100,-574.8) 42(-50,-574.8) 43(0,-574.8) 44(50,-574.8) 45(100,-574.8) 46(150,-574.8) 47(200,-574.8) 48(250,-574.8) 49(300,-574.8) 50(350,-574.8) 51(400,-574.8) 52(450,-574.8) 53(500,-574.8) 75(500,574.8) 76(450,574.8) 77(400,574.8) 78(350,574.8) 79(300,574.8) 80(250,574.8) 81(200,574.8) 82(150,574.8) 83(100,574.8) 84(50,574.8)
  rect 86.61x31.5 smd: 12(-574.8,500) 13(-574.8,450) 14(-574.8,400) 15(-574.8,350) 16(-574.8,300) 17(-574.8,250) 18(-574.8,200) 19(-574.8,150) 20(-574.8,100) 21(-574.8,50) 22(-574.8,0) 23(-574.8,-50) 24(-574.8,-100) 25(-574.8,-150) 26(-574.8,-200) 27(-574.8,-250) 28(-574.8,-300) 29(-574.8,-350) 30(-574.8,-400) 31(-574.8,-450) 32(-574.8,-500) 54(574.8,-500) 55(574.8,-450) 56(574.8,-400) 57(574.8,-350) 58(574.8,-300) 59(574.8,-250) 60(574.8,-200) 61(574.8,-150) 62(574.8,-100) 63(574.8,-50) 64(574.8,0) 65(574.8,50) 66(574.8,100) 67(574.8,150) 68(574.8,200) 69(574.8,250) 70(574.8,300) 71(574.8,350) 72(574.8,400) 73(574.8,450) 74(574.8,500)
Top Overlay:
  text "1" at -25,418.11 h77.5
Mechanical 16:
  drawing of 173 lines, arcs and shapes, not listed
Mechanical 27:
  lines w7.87: -626.1,-626.1 626.1,-626.1 626.1,626.1 -626.1,626.1 -626.1,-626.1

## LCC-100 [mil]
pads (100):
  rect 31.5x133.86 smd: 1(0,649.61)
  rect 31.5x86.61 smd: 2(-50,673.23) 3(-100,673.23) 4(-150,673.23) 5(-200,673.23) 6(-250,673.23) 7(-300,673.23) 8(-350,673.23) 9(-400,673.23) 10(-450,673.23) 11(-500,673.23) 12(-550,673.23) 13(-600,673.23) 39(-600,-673.23) 40(-550,-673.23) 41(-500,-673.23) 42(-450,-673.23) 43(-400,-673.23) 44(-350,-673.23) 45(-300,-673.23) 46(-250,-673.23) 47(-200,-673.23) 48(-150,-673.23) 49(-100,-673.23) 50(-50,-673.23) 51(0,-673.23) 52(50,-673.23) 53(100,-673.23) 54(150,-673.23) 55(200,-673.23) 56(250,-673.23) 57(300,-673.23) 58(350,-673.23) 59(400,-673.23) 60(450,-673.23) 61(500,-673.23) 62(550,-673.23) 63(600,-673.23) 89(600,673.23) 90(550,673.23) 91(500,673.23) 92(450,673.23) 93(400,673.23) 94(350,673.23) 95(300,673.23) 96(250,673.23) 97(200,673.23) 98(150,673.23) 99(100,673.23) 100(50,673.23)
  rect 86.61x31.5 smd: 14(-673.23,600) 15(-673.23,550) 16(-673.23,500) 17(-673.23,450) 18(-673.23,400) 19(-673.23,350) 20(-673.23,300) 21(-673.23,250) 22(-673.23,200) 23(-673.23,150) 24(-673.23,100) 25(-673.23,50) 26(-673.23,0) 27(-673.23,-50) 28(-673.23,-100) 29(-673.23,-150) 30(-673.23,-200) 31(-673.23,-250) 32(-673.23,-300) 33(-673.23,-350) 34(-673.23,-400) 35(-673.23,-450) 36(-673.23,-500) 37(-673.23,-550) 38(-673.23,-600) 64(673.23,-600) 65(673.23,-550) 66(673.23,-500) 67(673.23,-450) 68(673.23,-400) 69(673.23,-350) 70(673.23,-300) 71(673.23,-250) 72(673.23,-200) 73(673.23,-150) 74(673.23,-100) 75(673.23,-50) 76(673.23,0) 77(673.23,50) 78(673.23,100) 79(673.23,150) 80(673.23,200) 81(673.23,250) 82(673.23,300) 83(673.23,350) 84(673.23,400) 85(673.23,450) 86(673.23,500) 87(673.23,550) 88(673.23,600)
Top Overlay:
  text "1" at -25,518.11 h77.5
Mechanical 16:
  drawing of 205 lines, arcs and shapes, not listed
Mechanical 27:
  lines w7.87: -724.53,-724.53 724.53,-724.53 724.53,724.53 -724.53,724.53 -724.53,-724.53

## LCC-124 [mil]
pads (124):
  rect 31.5x133.86 smd: 1(0,803.15)
  rect 31.5x86.61 smd: 2(-50,826.77) 3(-100,826.77) 4(-150,826.77) 5(-200,826.77) 6(-250,826.77) 7(-300,826.77) 8(-350,826.77) 9(-400,826.77) 10(-450,826.77) 11(-500,826.77) 12(-550,826.77) 13(-600,826.77) 14(-650,826.77) 15(-700,826.77) 16(-750,826.77) 48(-750,-826.77) 49(-700,-826.77) 50(-650,-826.77) 51(-600,-826.77) 52(-550,-826.77) 53(-500,-826.77) 54(-450,-826.77) 55(-400,-826.77) 56(-350,-826.77) 57(-300,-826.77) 58(-250,-826.77) 59(-200,-826.77) 60(-150,-826.77) 61(-100,-826.77) 62(-50,-826.77) 63(0,-826.77) 64(50,-826.77) 65(100,-826.77) 66(150,-826.77) 67(200,-826.77) 68(250,-826.77) 69(300,-826.77) 70(350,-826.77) 71(400,-826.77) 72(450,-826.77) 73(500,-826.77) 74(550,-826.77) 75(600,-826.77) 76(650,-826.77) 77(700,-826.77) 78(750,-826.77) 110(750,826.77) 111(700,826.77) 112(650,826.77) 113(600,826.77) 114(550,826.77) 115(500,826.77) 116(450,826.77) 117(400,826.77) 118(350,826.77) 119(300,826.77) 120(250,826.77) 121(200,826.77) 122(150,826.77) 123(100,826.77) 124(50,826.77)
  rect 86.61x31.5 smd: 17(-826.77,750) 18(-826.77,700) 19(-826.77,650) 20(-826.77,600) 21(-826.77,550) 22(-826.77,500) 23(-826.77,450) 24(-826.77,400) 25(-826.77,350) 26(-826.77,300) 27(-826.77,250) 28(-826.77,200) 29(-826.77,150) 30(-826.77,100) 31(-826.77,50) 32(-826.77,0) 33(-826.77,-50) 34(-826.77,-100) 35(-826.77,-150) 36(-826.77,-200) 37(-826.77,-250) 38(-826.77,-300) 39(-826.77,-350) 40(-826.77,-400) 41(-826.77,-450) 42(-826.77,-500) 43(-826.77,-550) 44(-826.77,-600) 45(-826.77,-650) 46(-826.77,-700) 47(-826.77,-750) 79(826.77,-750) 80(826.77,-700) 81(826.77,-650) 82(826.77,-600) 83(826.77,-550) 84(826.77,-500) 85(826.77,-450) 86(826.77,-400) 87(826.77,-350) 88(826.77,-300) 89(826.77,-250) 90(826.77,-200) 91(826.77,-150) 92(826.77,-100) 93(826.77,-50) 94(826.77,0) 95(826.77,50) 96(826.77,100) 97(826.77,150) 98(826.77,200) 99(826.77,250) 100(826.77,300) 101(826.77,350) 102(826.77,400) 103(826.77,450) 104(826.77,500) 105(826.77,550) 106(826.77,600) 107(826.77,650) 108(826.77,700) 109(826.77,750)
Top Overlay:
  text "1" at -25,668.11 h77.5
Mechanical 16:
  drawing of 253 lines, arcs and shapes, not listed
Mechanical 27:
  lines w7.87: -882.01,-882.01 882.01,-882.01 882.01,882.01 -882.01,882.01 -882.01,-882.01

## LCC-156 [mil]
pads (156):
  rect 31.5x133.86 smd: 1(0,1000)
  rect 31.5x86.61 smd: 2(-50,1023.62) 3(-100,1023.62) 4(-150,1023.62) 5(-200,1023.62) 6(-250,1023.62) 7(-300,1023.62) 8(-350,1023.62) 9(-400,1023.62) 10(-450,1023.62) 11(-500,1023.62) 12(-550,1023.62) 13(-600,1023.62) 14(-650,1023.62) 15(-700,1023.62) 16(-750,1023.62) 17(-800,1023.62) 18(-850,1023.62) 19(-900,1023.62) 20(-950,1023.62) 60(-950,-1023.62) 61(-900,-1023.62) 62(-850,-1023.62) 63(-800,-1023.62) 64(-750,-1023.62) 65(-700,-1023.62) 66(-650,-1023.62) 67(-600,-1023.62) 68(-550,-1023.62) 69(-500,-1023.62) 70(-450,-1023.62) 71(-400,-1023.62) 72(-350,-1023.62) 73(-300,-1023.62) 74(-250,-1023.62) 75(-200,-1023.62) 76(-150,-1023.62) 77(-100,-1023.62) 78(-50,-1023.62) 79(0,-1023.62) 80(50,-1023.62) 81(100,-1023.62) 82(150,-1023.62) 83(200,-1023.62) 84(250,-1023.62) 85(300,-1023.62) 86(350,-1023.62) 87(400,-1023.62) 88(450,-1023.62) 89(500,-1023.62) 90(550,-1023.62) 91(600,-1023.62) 92(650,-1023.62) 93(700,-1023.62) 94(750,-1023.62) 95(800,-1023.62) 96(850,-1023.62) 97(900,-1023.62) 98(950,-1023.62) 138(950,1023.62) 139(900,1023.62) 140(850,1023.62) 141(800,1023.62) 142(750,1023.62) 143(700,1023.62) 144(650,1023.62) 145(600,1023.62) 146(550,1023.62) 147(500,1023.62) 148(450,1023.62) 149(400,1023.62) 150(350,1023.62) 151(300,1023.62) 152(250,1023.62) 153(200,1023.62) 154(150,1023.62) 155(100,1023.62) 156(50,1023.62)
  rect 86.61x31.5 smd: 21(-1023.62,950) 22(-1023.62,900) 23(-1023.62,850) 24(-1023.62,800) 25(-1023.62,750) 26(-1023.62,700) 27(-1023.62,650) 28(-1023.62,600) 29(-1023.62,550) 30(-1023.62,500) 31(-1023.62,450) 32(-1023.62,400) 33(-1023.62,350) 34(-1023.62,300) 35(-1023.62,250) 36(-1023.62,200) 37(-1023.62,150) 38(-1023.62,100) 39(-1023.62,50) 40(-1023.62,0) 41(-1023.62,-50) 42(-1023.62,-100) 43(-1023.62,-150) 44(-1023.62,-200) 45(-1023.62,-250) 46(-1023.62,-300) 47(-1023.62,-350) 48(-1023.62,-400) 49(-1023.62,-450) 50(-1023.62,-500) 51(-1023.62,-550) 52(-1023.62,-600) 53(-1023.62,-650) 54(-1023.62,-700) 55(-1023.62,-750) 56(-1023.62,-800) 57(-1023.62,-850) 58(-1023.62,-900) 59(-1023.62,-950) 99(1023.62,-950) 100(1023.62,-900) 101(1023.62,-850) 102(1023.62,-800) 103(1023.62,-750) 104(1023.62,-700) 105(1023.62,-650) 106(1023.62,-600) 107(1023.62,-550) 108(1023.62,-500) 109(1023.62,-450) 110(1023.62,-400) 111(1023.62,-350) 112(1023.62,-300) 113(1023.62,-250) 114(1023.62,-200) 115(1023.62,-150) 116(1023.62,-100) 117(1023.62,-50) 118(1023.62,0) 119(1023.62,50) 120(1023.62,100) 121(1023.62,150) 122(1023.62,200) 123(1023.62,250) 124(1023.62,300) 125(1023.62,350) 126(1023.62,400) 127(1023.62,450) 128(1023.62,500) 129(1023.62,550) 130(1023.62,600) 131(1023.62,650) 132(1023.62,700) 133(1023.62,750) 134(1023.62,800) 135(1023.62,850) 136(1023.62,900) 137(1023.62,950)
Top Overlay:
  text "1" at -25,868.11 h77.5
Mechanical 16:
  drawing of 317 lines, arcs and shapes, not listed
Mechanical 27:
  lines w7.87: -1078.86,-1078.86 1078.86,-1078.86 1078.86,1078.86 -1078.86,1078.86 -1078.86,-1078.86

## M0805 [mm]
pads (2):
  rect 1.3x1.6 smd: 1(-0.95,0) 2(0.95,0)
Mechanical 6:
  rectangle: -0.2,-0.6 0.2,0.6
Mechanical 16:
  rectangle: -1.041,-0.711 -0.686,0.711
  rectangle: 0.686,-0.711 1.041,0.711
  lines w0.152: -0.711,-0.635 0.711,-0.635 ; -0.711,0.635 0.711,0.635
Mechanical 27:
  lines w0.051: -1.973,-0.983 1.973,-0.983 1.973,0.983 -1.973,0.983 -1.973,-0.983

## M1206 [mm]
pads (2):
  rect 1.6x2 smd: 1(-1.4,0) 2(1.4,0)
Mechanical 6:
  rectangle: -0.3,-0.8 0.3,0.8
Mechanical 16:
  rectangle: -1.702,-0.914 -1.118,0.914
  rectangle: 1.118,-0.914 1.702,0.914
  lines w0.152: -1.143,-0.838 1.143,-0.838 ; -1.143,0.838 1.143,0.838
Mechanical 27:
  lines w0.051: -2.473,-1.483 2.473,-1.483 2.473,1.483 -2.473,1.483 -2.473,-1.483